# Altium footprint library Connectors THD.PcbLib: 631 footprints (part 18 of 46)
Each footprint in its own frame and in the unit in brackets; x right, y up, seen from the top. Pads: shape width x height; smd on the part's side, far side on the other; paste and mask are expansions set on the pad; w line width, h text height; cw(c..) or ccw(c..) is an arc to the next point about the centre after c.
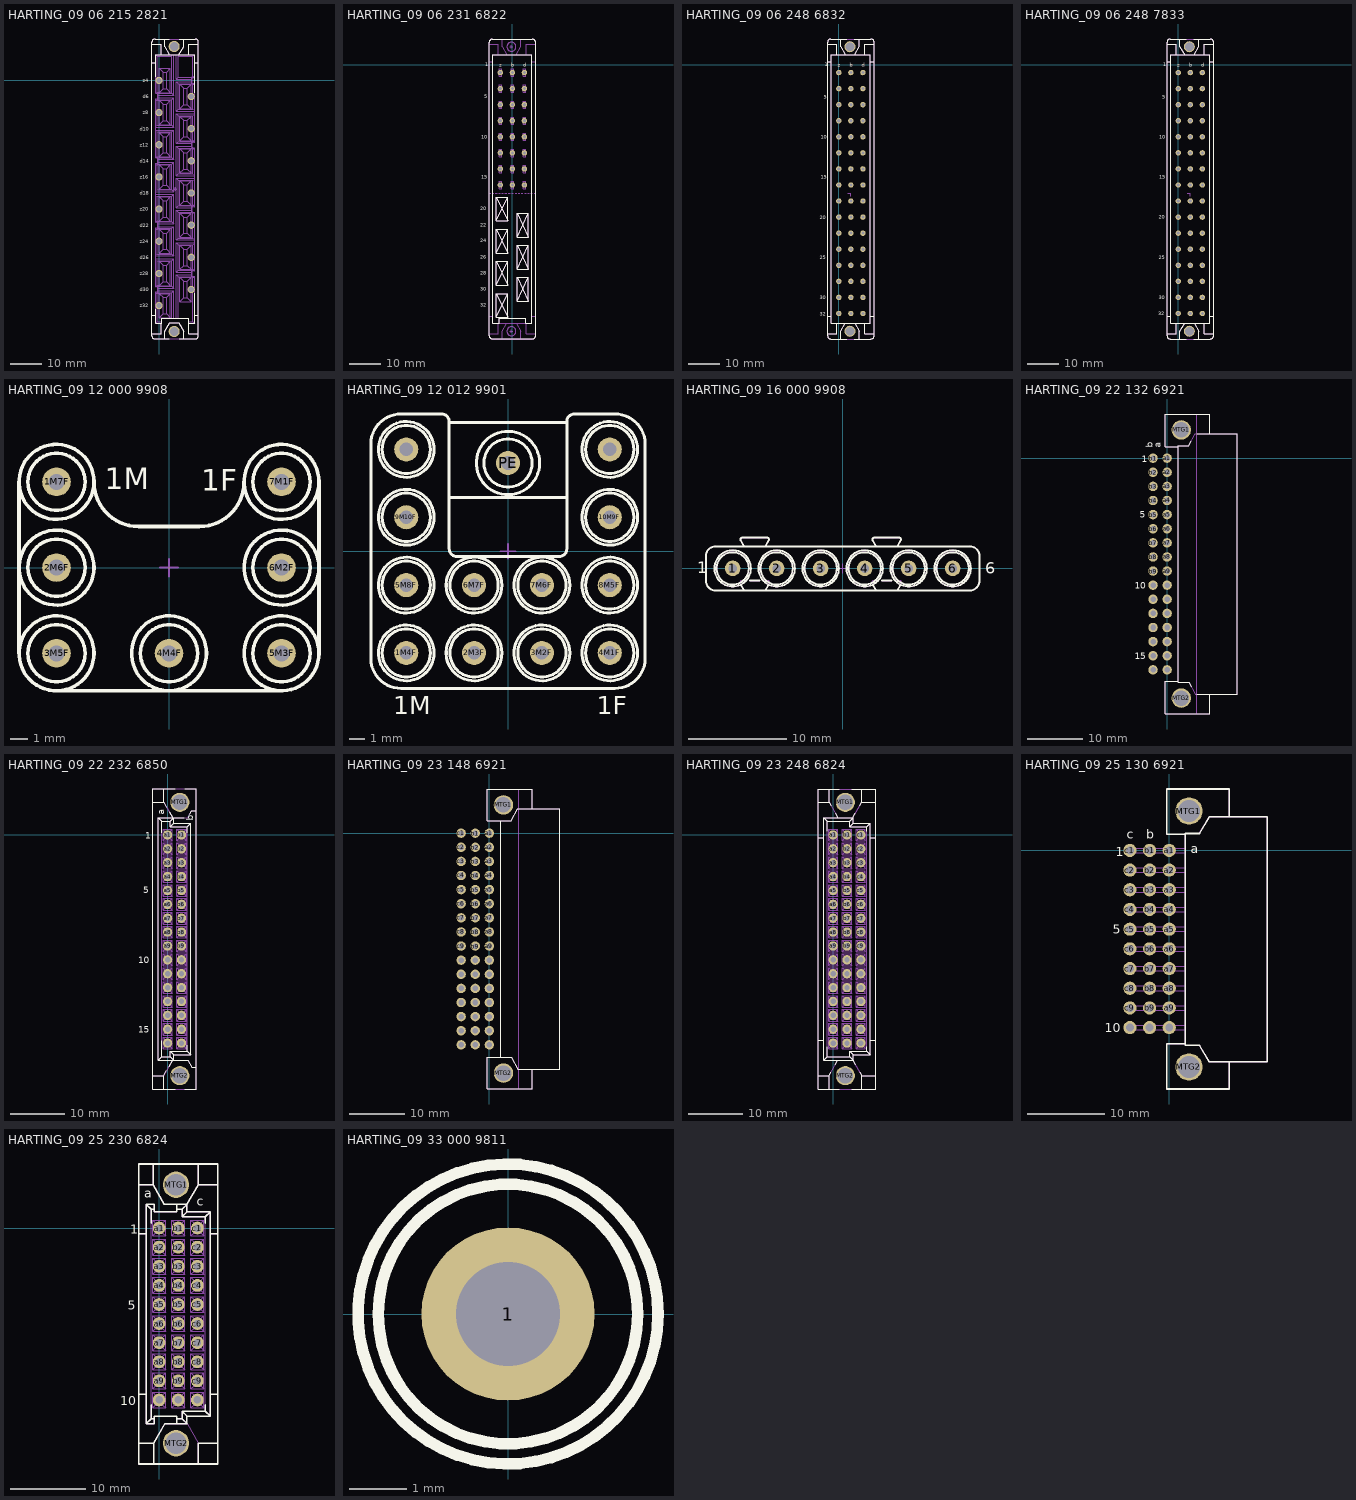
[diagram p17: the footprints below, top view; thin cyan lines are the x and y axes]

## HARTING_09 06 215 2821 [mm] "DIN 41612, Type H, 15 Poles, Rows z+d, Performance level 1, Low Profile Straight Female Connector, Lead 4.0 mm, Pitch 5.08mm"
height 10.1
pads (17):
  round 2.3 hole 1.6: d6(10.16,-5.08) d10(10.16,-15.24) d14(10.16,-25.4) d18(10.16,-35.56) d22(10.16,-45.72) d26(10.16,-55.88) d30(10.16,-66.04) z4(0,0) z8(0,-10.16) z12(0,-20.32) z16(0,-30.48) z20(0,-40.64) z24(0,-50.8) z28(0,-60.96) z32(0,-71.12)
  round 3.5 / inner round 3.5 / far side round 5.1 hole 2.8: MTG1(4.78,10.71) MTG2(4.78,-79.29)
Top Overlay:
  lines w0.2: -1.105,-74.24 -2.27,-74.24 ; -1.105,-72.277 -1.105,-76.7 0.855,-76.7 0.855,-76.15 0.855,-75.13 9.305,-75.13 9.305,-76.15 9.305,-76.7 11.265,-76.7 11.265,-67.197 ; -1.105,1.157 -1.105,8.12 11.265,8.12 11.265,-3.923 ; -1.105,5.66 -2.27,5.66 ; 0.705,-76.7 0.705,-80.04 -2.27,-80.04 ; 0.705,8.12 0.705,11.46 -2.27,11.46 ; 3.175,-81.665 1.805,-81.665 ; 3.175,13.085 1.805,13.085 ; 3.3,8.12 1.805,10.71 1.805,13.085 ; 6.26,8.12 7.755,10.71 7.755,13.085 ; 6.385,-81.665 7.755,-81.665 ; 6.385,13.085 7.755,13.085 ; 9.455,-76.7 9.455,-80.04 12.43,-80.04 ; 9.455,8.12 9.455,11.46 12.43,11.46 ; 11.265,-74.24 12.43,-74.24 ; 11.265,5.66 12.43,5.66 ; -2.27,-80.04 -2.27,-80.665 ccw(c-1.27,-80.665) -1.27,-81.665 1.805,-81.665 ; -2.27,-80.04 -2.27,-74.24 ; -2.27,-74.24 -2.27,5.66 ; -2.27,5.66 -2.27,11.46 ; -2.27,11.46 -2.27,12.085 cw(c-1.27,12.085) -1.27,13.085 1.805,13.085 ; 1.805,-81.665 1.805,-79.29 3.378,-76.565 6.182,-76.565 7.755,-79.29 7.755,-81.665 ; 7.755,-81.665 11.43,-81.665 ccw(c11.43,-80.665) 12.43,-80.665 12.43,-80.04 ; 7.755,13.085 11.43,13.085 cw(c11.43,12.085) 12.43,12.085 12.43,11.46 ; 12.43,-80.04 12.43,-74.24 ; 12.43,-74.24 12.43,5.66 ; 12.43,5.66 12.43,11.46
  text "z32" at -6.02,-71.695 h1.2
  text "z28" at -6.02,-61.535 h1.2
  text "d30" at -6.02,-66.615 h1.2
  text "z24" at -6.02,-51.375 h1.2
  text "d26" at -6.145,-56.455 h1.2
  text "z20" at -6.02,-41.215 h1.2
  text "d22" at -6.02,-46.295 h1.2
  text "z16" at -6.02,-31.055 h1.2
  text "d18" at -6.02,-36.135 h1.2
  text "z12" at -6.02,-20.895 h1.2
  text "d14" at -6.02,-25.975 h1.2
  text "z8" at -5.125,-10.685 h1.2
  text "d10" at -6.02,-15.815 h1.2
  text "d6" at -5.125,-5.605 h1.2
  text "z4" at -5.125,-0.525 h1.2
Mechanical 8:
  lines w0.1: -0.5,-71.12 0,-71.12 ; -0.5,-60.96 0,-60.96 ; -0.5,-50.8 0,-50.8 ; -0.5,-40.64 0,-40.64 ; -0.5,-30.48 0,-30.48 ; -0.5,-20.32 0,-20.32 ; -0.5,-10.16 0,-10.16 ; -0.5,0 0,0 ; 0,-71.62 0,-71.12 ; 0,-70.62 0,-71.12 ; 0,-61.46 0,-60.96 ; 0,-60.46 0,-60.96 ; 0,-51.3 0,-50.8 ; 0,-50.3 0,-50.8 ; 0,-41.14 0,-40.64 ; 0,-40.14 0,-40.64 ; 0,-30.98 0,-30.48 ; 0,-29.98 0,-30.48 ; 0,-20.82 0,-20.32 ; 0,-19.82 0,-20.32 ; 0,-10.66 0,-10.16 ; 0,-9.66 0,-10.16 ; 0,-0.5 0,0 ; 0,0.5 0,0 ; 0.5,-71.12 0,-71.12 ; 0.5,-60.96 0,-60.96 ; 0.5,-50.8 0,-50.8 ; 0.5,-40.64 0,-40.64 ; 0.5,-30.48 0,-30.48 ; 0.5,-20.32 0,-20.32 ; 0.5,-10.16 0,-10.16 ; 0.5,0 0,0 ; 4.28,-79.29 4.78,-79.29 ; 4.28,10.71 4.78,10.71 ; 4.78,-79.79 4.78,-79.29 ; 4.78,-78.79 4.78,-79.29 ; 4.78,10.21 4.78,10.71 ; 4.78,11.21 4.78,10.71 ; 5.28,-79.29 4.78,-79.29 ; 5.28,10.71 4.78,10.71 ; 9.66,-66.04 10.16,-66.04 ; 9.66,-55.88 10.16,-55.88 ; 9.66,-45.72 10.16,-45.72 ; 9.66,-35.56 10.16,-35.56 ; 9.66,-25.4 10.16,-25.4 ; 9.66,-15.24 10.16,-15.24 ; 9.66,-5.08 10.16,-5.08 ; 10.16,-66.54 10.16,-66.04 ; 10.16,-65.54 10.16,-66.04 ; 10.16,-56.38 10.16,-55.88 ; 10.16,-55.38 10.16,-55.88 ; 10.16,-46.22 10.16,-45.72 ; 10.16,-45.22 10.16,-45.72 ; 10.16,-36.06 10.16,-35.56 ; 10.16,-35.06 10.16,-35.56 ; 10.16,-25.9 10.16,-25.4 ; 10.16,-24.9 10.16,-25.4 ; 10.16,-15.74 10.16,-15.24 ; 10.16,-14.74 10.16,-15.24 ; 10.16,-5.58 10.16,-5.08 ; 10.16,-4.58 10.16,-5.08 ; 10.66,-66.04 10.16,-66.04 ; 10.66,-55.88 10.16,-55.88 ; 10.66,-45.72 10.16,-45.72 ; 10.66,-35.56 10.16,-35.56 ; 10.66,-25.4 10.16,-25.4 ; 10.66,-15.24 10.16,-15.24 ; 10.66,-5.08 10.16,-5.08 ; 5.08,-34.29 5.08,-33.79 5.08,-34.29 ; 5.08,-34.29 5.58,-34.29 5.08,-34.29 ; 5.08,-34.29 5.08,-34.79 5.08,-34.29 ; 5.08,-34.29 4.58,-34.29 5.08,-34.29
Mechanical 14:
  drawing of 585 lines, arcs and shapes, not listed
  text "z4" at -5.125,-0.525 h1.2
  text "d6" at -5.125,-5.605 h1.2
  text "d10" at -6.02,-15.815 h1.2
  text "z8" at -5.125,-10.685 h1.2
  text "d14" at -6.02,-25.975 h1.2
  text "z12" at -6.02,-20.895 h1.2
  text "d18" at -6.02,-36.135 h1.2
  text "z16" at -6.02,-31.055 h1.2
  text "d22" at -6.02,-46.295 h1.2
  text "z20" at -6.02,-41.215 h1.2
  text "d26" at -6.145,-56.455 h1.2
  text "z24" at -6.02,-51.375 h1.2
  text "d30" at -6.02,-66.615 h1.2
  text "z28" at -6.02,-61.535 h1.2
  text "z32" at -6.02,-71.695 h1.2
  text "z4" at -5.125,-0.525 h1.2
  text "d6" at -5.125,-5.605 h1.2
  text "d10" at -6.02,-15.815 h1.2
  text "z8" at -5.125,-10.685 h1.2
  text "d14" at -6.02,-25.975 h1.2
  text "z12" at -6.02,-20.895 h1.2
  text "d18" at -6.02,-36.135 h1.2
  text "z16" at -6.02,-31.055 h1.2
  text "d22" at -6.02,-46.295 h1.2
  text "z20" at -6.02,-41.215 h1.2
  text "d26" at -6.145,-56.455 h1.2
  text "z24" at -6.02,-51.375 h1.2
  text "d30" at -6.02,-66.615 h1.2
  text "z28" at -6.02,-61.535 h1.2
  text "z32" at -6.02,-71.695 h1.2
  text "z32" at -6.02,-71.695 h1.2
  text "z28" at -6.02,-61.535 h1.2
  text "d30" at -6.02,-66.615 h1.2
  text "z24" at -6.02,-51.375 h1.2
  text "d26" at -6.145,-56.455 h1.2
  text "z20" at -6.02,-41.215 h1.2
  text "d22" at -6.02,-46.295 h1.2
  text "z16" at -6.02,-31.055 h1.2
  text "d18" at -6.02,-36.135 h1.2
  text "z12" at -6.02,-20.895 h1.2
  text "d14" at -6.02,-25.975 h1.2
  text "z8" at -5.125,-10.685 h1.2
  text "d10" at -6.02,-15.815 h1.2
  text "d6" at -5.125,-5.605 h1.2
  text "z4" at -5.125,-0.525 h1.2
3D body: height 10.1, standoff -4, extent -2.27,-81.665 12.43,13.085

## HARTING_09 06 231 6822 [mm] "DIN 41612, Type MH, 24+ 7 Contacts, Rows z+b+d, Performance level 2, Straight Female Connector"
height 20.53
pads (24):
  round 1.7 hole 1: b2(0,-2.54) b4(0,-7.62) b6(0,-12.7) b8(0,-17.78) b10(0,-22.86) b12(0,-27.94) b14(0,-33.02) b16(0,-38.1) d2(3.81,-2.54) d4(3.81,-7.62) d6(3.81,-12.7) d8(3.81,-17.78) d10(3.81,-22.86) d12(3.81,-27.94) d14(3.81,-33.02) d16(3.81,-38.1) z2(-3.81,-2.54) z4(-3.81,-7.62) z6(-3.81,-12.7) z8(-3.81,-17.78) z10(-3.81,-22.86) z12(-3.81,-27.94) z14(-3.81,-33.02) z16(-3.81,-38.1)
Top Overlay:
  lines w0.2: -5.025,-79.965 -1.475,-72.435 ; -5.025,-79.965 -5.025,-72.435 ; -5.025,-79.965 -1.475,-79.965 ; -5.025,-72.435 -1.475,-79.965 ; -5.025,-72.435 -1.475,-72.435 ; -5.025,-69.805 -1.475,-62.275 ; -5.025,-69.805 -5.025,-62.275 ; -5.025,-69.805 -1.475,-69.805 ; -5.025,-62.275 -1.475,-69.805 ; -5.025,-62.275 -1.475,-62.275 ; -5.025,-59.645 -1.475,-52.115 ; -5.025,-59.645 -5.025,-52.115 ; -5.025,-59.645 -1.475,-59.645 ; -5.025,-52.115 -1.475,-59.645 ; -5.025,-52.115 -1.475,-52.115 ; -5.025,-49.485 -1.475,-41.955 ; -5.025,-49.485 -5.025,-41.955 ; -5.025,-49.485 -1.475,-49.485 ; -5.025,-41.955 -1.475,-49.485 ; -5.025,-41.955 -1.475,-41.955 ; -1.475,-79.965 -1.475,-72.435 ; -1.475,-69.805 -1.475,-62.275 ; -1.475,-59.645 -1.475,-52.115 ; -1.475,-49.485 -1.475,-41.955 ; 1.475,-74.885 5.025,-74.885 ; 1.475,-74.885 5.025,-67.355 ; 1.475,-74.885 1.475,-67.355 ; 1.475,-67.355 5.025,-67.355 ; 1.475,-67.355 5.025,-74.885 ; 1.475,-64.725 5.025,-57.195 ; 1.475,-64.725 1.475,-57.195 ; 1.475,-64.725 5.025,-64.725 ; 1.475,-57.195 5.025,-64.725 ; 1.475,-57.195 5.025,-57.195 ; 1.475,-54.565 5.025,-47.035 ; 1.475,-54.565 1.475,-47.035 ; 1.475,-54.565 5.025,-54.565 ; 1.475,-47.035 5.025,-54.565 ; 1.475,-47.035 5.025,-47.035 ; 5.025,-74.885 5.025,-67.355 ; 5.025,-64.725 5.025,-57.195 ; 5.025,-54.565 5.025,-47.035 ; -7.35,-85.745 ccw(c-6.35,-85.745) -6.35,-86.745 6.35,-86.745 ccw(c6.35,-85.745) 7.35,-85.745 7.35,7.005 ccw(c6.35,7.005) 6.35,8.005 -6.35,8.005 ccw(c-6.35,7.005) -7.35,7.005 -7.35,-85.745 ; -6.185,-81.795 -4.165,-81.795 -4.165,-80.265 4.165,-80.265 4.165,-81.795 6.185,-81.795 6.185,3.055 -6.185,3.055 -6.185,-81.795
  text "30" at -10.109,-71.56 h1.2
  text "26" at -10.109,-61.4 h1.2
  text "22" at -10.109,-51.24 h1.2
  text "32" at -10.1,-76.605 h1.2
  text "28" at -10.1,-66.445 h1.2
  text "24" at -10.1,-56.285 h1.2
  text "d" at 3.492,-0.635 h1.2
  text "z" at -4.127,-0.635 h1.2
  text "b" at -0.318,-0.635 h1.2
  text "5" at -8.925,-10.725 h1.2
  text "10" at -9.885,-23.42 h1.2
  text "15" at -9.885,-36.12 h1.2
  text "20" at -10.1,-46.125 h1.2
  text "1" at -8.625,-0.525 h1.2
Mechanical 8:
  lines w0.1: -7.35,-40.64 -6.85,-40.64 ; -6.35,-40.64 -5.85,-40.64 ; -5.35,-40.64 -4.85,-40.64 ; -4.35,-40.64 -3.85,-40.64 ; -4.31,-38.1 -3.81,-38.1 ; -4.31,-33.02 -3.81,-33.02 ; -4.31,-27.94 -3.81,-27.94 ; -4.31,-22.86 -3.81,-22.86 ; -4.31,-17.78 -3.81,-17.78 ; -4.31,-12.7 -3.81,-12.7 ; -4.31,-7.62 -3.81,-7.62 ; -3.81,-38.6 -3.81,-38.1 ; -3.81,-37.6 -3.81,-38.1 ; -3.81,-33.52 -3.81,-33.02 ; -3.81,-32.52 -3.81,-33.02 ; -3.81,-28.44 -3.81,-27.94 ; -3.81,-27.44 -3.81,-27.94 ; -3.81,-23.36 -3.81,-22.86 ; -3.81,-22.36 -3.81,-22.86 ; -3.81,-18.28 -3.81,-17.78 ; -3.81,-17.28 -3.81,-17.78 ; -3.81,-13.2 -3.81,-12.7 ; -3.81,-12.2 -3.81,-12.7 ; -3.81,-8.12 -3.81,-7.62 ; -3.81,-7.12 -3.81,-7.62 ; -3.35,-40.64 -2.85,-40.64 ; -3.31,-38.1 -3.81,-38.1 ; -3.31,-33.02 -3.81,-33.02 ; -3.31,-27.94 -3.81,-27.94 ; -3.31,-22.86 -3.81,-22.86 ; -3.31,-17.78 -3.81,-17.78 ; -3.31,-12.7 -3.81,-12.7 ; -3.31,-7.62 -3.81,-7.62 ; -2.35,-40.64 -1.85,-40.64 ; -1.35,-40.64 -0.65,-40.64 ; -0.8,-84.37 -0.3,-84.37 ; -0.8,5.63 -0.3,5.63 ; -0.5,-38.1 0,-38.1 ; -0.5,-33.02 0,-33.02 ; -0.5,-27.94 0,-27.94 ; -0.5,-22.86 0,-22.86 ; -0.5,-17.78 0,-17.78 ; -0.5,-12.7 0,-12.7 ; -0.5,-7.62 0,-7.62 ; -0.5,-2.54 0,-2.54 ; -0.3,-84.87 -0.3,-84.37 ; -0.3,-83.87 -0.3,-84.37 ; -0.3,5.13 -0.3,5.63 ; -0.3,6.13 -0.3,5.63 ; -0.15,-40.64 0.35,-40.64 ; 0,-38.6 0,-38.1 ; 0,-37.6 0,-38.1 ; 0,-33.52 0,-33.02 ; 0,-32.52 0,-33.02 ; 0,-28.44 0,-27.94 ; 0,-27.44 0,-27.94 ; 0,-23.36 0,-22.86 ; 0,-22.36 0,-22.86 ; 0,-18.28 0,-17.78 ; 0,-17.28 0,-17.78 ; 0,-13.2 0,-12.7 ; 0,-12.2 0,-12.7 ; 0,-8.12 0,-7.62 ; 0,-7.12 0,-7.62 ; 0,-3.04 0,-2.54 ; 0,-2.04 0,-2.54 ; 0.2,-84.37 -0.3,-84.37 ; 0.2,5.63 -0.3,5.63 ; 0.5,-38.1 0,-38.1 ; 0.5,-33.02 0,-33.02 ; 0.5,-27.94 0,-27.94 ; 0.5,-22.86 0,-22.86 ; 0.5,-17.78 0,-17.78 ; 0.5,-12.7 0,-12.7 ; 0.5,-7.62 0,-7.62 ; 0.5,-2.54 0,-2.54 ; 0.85,-40.64 1.35,-40.64 ; 1.85,-40.64 2.35,-40.64 ; 2.85,-40.64 3.35,-40.64 ; 3.31,-38.1 3.81,-38.1 ; 3.31,-33.02 3.81,-33.02 ; 3.31,-27.94 3.81,-27.94 ; 3.31,-22.86 3.81,-22.86 ; 3.31,-17.78 3.81,-17.78 ; 3.31,-12.7 3.81,-12.7 ; 3.31,-7.62 3.81,-7.62 ; 3.31,-2.54 3.81,-2.54 ; 3.81,-38.6 3.81,-38.1 ; 3.81,-37.6 3.81,-38.1 ; 3.81,-33.52 3.81,-33.02 ; 3.81,-32.52 3.81,-33.02 ; 3.81,-28.44 3.81,-27.94 ; 3.81,-27.44 3.81,-27.94 ; 3.81,-23.36 3.81,-22.86 ; 3.81,-22.36 3.81,-22.86 ; 3.81,-18.28 3.81,-17.78 ; 3.81,-17.28 3.81,-17.78 ; 3.81,-13.2 3.81,-12.7 ; 3.81,-12.2 3.81,-12.7 ; 3.81,-8.12 3.81,-7.62 ; 3.81,-7.12 3.81,-7.62 ; 3.81,-3.04 3.81,-2.54 ; 3.81,-2.04 3.81,-2.54 ; 3.85,-40.64 4.35,-40.64 ; 4.31,-38.1 3.81,-38.1 ; 4.31,-33.02 3.81,-33.02 ; 4.31,-27.94 3.81,-27.94 ; 4.31,-22.86 3.81,-22.86 ; 4.31,-17.78 3.81,-17.78 ; 4.31,-12.7 3.81,-12.7 ; 4.31,-7.62 3.81,-7.62 ; 4.31,-2.54 3.81,-2.54 ; 4.85,-40.64 5.35,-40.64 ; 5.85,-40.64 6.35,-40.64 ; 6.85,-40.64 7.35,-40.64 ; -3.81,-2.54 -4.31,-2.54 -3.81,-2.54 ; -3.81,-2.54 -3.81,-2.04 -3.81,-2.54 ; -3.81,-2.54 -3.31,-2.54 -3.81,-2.54 ; -3.81,-2.54 -3.81,-3.04 -3.81,-2.54
Mechanical 14:
  drawing of 190 lines, arcs and shapes, not listed
  text "b" at -0.318,-0.635 h1.2
  text "z" at -4.127,-0.635 h1.2
  text "d" at 3.492,-0.635 h1.2
  text "30" at -10.109,-71.56 h1.2
  text "26" at -10.109,-61.4 h1.2
  text "22" at -10.109,-51.24 h1.2
  text "32" at -10.1,-76.605 h1.2
  text "28" at -10.1,-66.445 h1.2
  text "24" at -10.1,-56.285 h1.2
  text "5" at -8.925,-10.725 h1.2
  text "10" at -9.885,-23.42 h1.2
  text "15" at -9.885,-36.12 h1.2
  text "20" at -10.1,-46.125 h1.2
  text "1" at -8.625,-0.525 h1.2
3D body: height 19.94, standoff -10.98, extent -7.35,-86.745 7.35,8.005

## HARTING_09 06 248 6832 [mm] "DIN 41612, Type F,  Thru-Hole Press-in Terminations;Rows z+b+d, 48 Contacts, Straight Female Connector, Performance level 2, Lead 5.6mm"
height 10.1
pads (50):
  round 1.7 hole 1: b2(3.81,-2.54) b4(3.81,-7.62) b6(3.81,-12.7) b8(3.81,-17.78) b10(3.81,-22.86) b12(3.81,-27.94) b14(3.81,-33.02) b16(3.81,-38.1) b18(3.81,-43.18) b20(3.81,-48.26) b22(3.81,-53.34) b24(3.81,-58.42) b26(3.81,-63.5) b28(3.81,-68.58) b30(3.81,-73.66) b32(3.81,-78.74) d2(7.62,-2.54) d4(7.62,-7.62) d6(7.62,-12.7) d8(7.62,-17.78) d10(7.62,-22.86) d12(7.62,-27.94) d14(7.62,-33.02) d16(7.62,-38.1) d18(7.62,-43.18) d20(7.62,-48.26) d22(7.62,-53.34) d24(7.62,-58.42) d26(7.62,-63.5) d28(7.62,-68.58) d30(7.62,-73.66) d32(7.62,-78.74) z2(0,-2.54) z4(0,-7.62) z6(0,-12.7) z8(0,-17.78) z10(0,-22.86) z12(0,-27.94) z14(0,-33.02) z16(0,-38.1) z18(0,-43.18) z20(0,-48.26) z22(0,-53.34) z24(0,-58.42) z26(0,-63.5) z28(0,-68.58) z30(0,-73.66) z32(0,-78.74)
  round 3.5 / inner round 3.5 / far side round 5.1 hole 2.8: MTG1(3.51,5.63) MTG2(3.51,-84.37)
Top Overlay:
  lines w0.2: -3.54,-85.22 -0.58,-85.22 -0.58,-81.845 ; -3.54,-79.57 -2.365,-79.57 ; -3.54,0.83 -2.365,0.83 ; -3.54,6.48 -0.58,6.48 -0.58,3.105 ; 0.535,-86.82 0.535,-84.37 1.993,-81.845 ; 0.535,8.08 0.535,5.63 1.993,3.105 ; 2.492,-86.82 -2.54,-86.82 cw(c-2.54,-85.82) -3.54,-85.82 -3.54,7.08 cw(c-2.54,7.08) -2.54,8.08 2.492,8.08 ; 4.874,-86.82 10.16,-86.82 ccw(c10.16,-85.82) 11.16,-85.82 11.16,7.08 ccw(c10.16,7.08) 10.16,8.08 4.874,8.08 ; 5.027,-81.845 6.485,-84.37 6.485,-86.82 ; 5.027,3.105 6.485,5.63 6.485,8.08 ; 8.17,-81.845 8.17,-85.22 11.16,-85.22 ; 8.17,3.105 8.17,6.48 11.16,6.48 ; 9.985,-79.57 11.16,-79.57 ; 9.985,0.83 11.16,0.83 ; -2.365,-81.845 9.985,-81.845 9.985,3.105 -2.365,3.105 -2.365,-81.845
  text "b" at 3.493,-0.635 h1.2
  text "z" at -0.317,-0.635 h1.2
  text "d" at 7.303,-0.635 h1.2
  text "1" at -4.49,-0.6 h1.2
  text "30" at -5.967,-74.295 h1.2
  text "25" at -5.967,-61.595 h1.2
  text "20" at -5.967,-48.895 h1.2
  text "15" at -5.75,-36.195 h1.2
  text "10" at -5.75,-23.495 h1.2
  text "5" at -4.79,-10.8 h1.2
  text "32" at -5.99,-79.4 h1.2
Mechanical 8:
  lines w0.1: 2.81,-40.64 3.81,-40.64 3.81,-41.64
Mechanical 14:
  circle w0.1: c3.51,5.63 r1.4
  circle w0.1: c3.51,-84.37 r1.4
  lines w0.1: -3.54,-85.22 -0.58,-85.22 -0.58,-81.845 ; -3.54,-79.57 -2.365,-79.57 ; -3.54,0.83 -2.365,0.83 ; -3.54,6.48 -0.58,6.48 -0.58,3.105 ; 0.535,-86.82 0.535,-84.37 1.993,-81.845 ; 0.535,8.08 0.535,5.63 1.993,3.105 ; 5.027,-81.845 6.485,-84.37 6.485,-86.82 ; 5.027,3.105 6.485,5.63 6.485,8.08 ; 8.17,-81.845 8.17,-85.22 11.16,-85.22 ; 8.17,3.105 8.17,6.48 11.16,6.48 ; 9.985,-79.57 11.16,-79.57 ; 9.985,0.83 11.16,0.83 ; -3.54,-85.82 ccw(c-2.54,-85.82) -2.54,-86.82 10.16,-86.82 ccw(c10.16,-85.82) 11.16,-85.82 11.16,7.08 ccw(c10.16,7.08) 10.16,8.08 -2.54,8.08 ccw(c-2.54,7.08) -3.54,7.08 -3.54,-85.82 ; -2.365,-81.845 -2.365,3.105 9.985,3.105 9.985,-81.845 -2.365,-81.845
  text "d" at 7.303,-0.635 h1.2
  text "z" at -0.317,-0.635 h1.2
  text "b" at 3.493,-0.635 h1.2
  text "1" at -4.49,-0.6 h1.2
  text "30" at -5.967,-74.295 h1.2
  text "25" at -5.967,-61.595 h1.2
  text "20" at -5.967,-48.895 h1.2
  text "15" at -5.75,-36.195 h1.2
  text "10" at -5.75,-23.495 h1.2
  text "5" at -4.79,-10.8 h1.2
  text "32" at -5.99,-79.4 h1.2
Drill Drawing:
  lines w0.1: -2.54,-60.96 -2.54,-81 9.985,-81 9.985,0 -2.54,0 -2.54,-22.86
  text "PRESS-FIT TECHNOLOGY diam. 1mm +0.1 -0" at -1.905,-59.055 h1
3D body: height 10.1, standoff -3.1, extent -3.59,-86.82 11.21,8.08

## HARTING_09 06 248 7833 [mm] "DIN 41612, Type F, 48 Contacts, Rows z+b+d, Performance level 3, Straight Female Connector"
height 10.1
pads (50):
  round 1.7 hole 1: b2(3.81,-2.54) b4(3.81,-7.62) b6(3.81,-12.7) b8(3.81,-17.78) b10(3.81,-22.86) b12(3.81,-27.94) b14(3.81,-33.02) b16(3.81,-38.1) b18(3.81,-43.18) b20(3.81,-48.26) b22(3.81,-53.34) b24(3.81,-58.42) b26(3.81,-63.5) b28(3.81,-68.58) b30(3.81,-73.66) b32(3.81,-78.74) d2(7.62,-2.54) d4(7.62,-7.62) d6(7.62,-12.7) d8(7.62,-17.78) d10(7.62,-22.86) d12(7.62,-27.94) d14(7.62,-33.02) d16(7.62,-38.1) d18(7.62,-43.18) d20(7.62,-48.26) d22(7.62,-53.34) d24(7.62,-58.42) d26(7.62,-63.5) d28(7.62,-68.58) d30(7.62,-73.66) d32(7.62,-78.74) z2(0,-2.54) z4(0,-7.62) z6(0,-12.7) z8(0,-17.78) z10(0,-22.86) z12(0,-27.94) z14(0,-33.02) z16(0,-38.1) z18(0,-43.18) z20(0,-48.26) z22(0,-53.34) z24(0,-58.42) z26(0,-63.5) z28(0,-68.58) z30(0,-73.66) z32(0,-78.74)
  round 3.5 / inner round 3.5 / far side round 5.1 hole 2.8: MTG1(3.51,5.63) MTG2(3.51,-84.37)
Top Overlay:
  lines w0.2: -3.54,-85.22 -0.58,-85.22 -0.58,-81.845 ; -3.54,-79.57 -2.365,-79.57 ; -3.54,0.83 -2.365,0.83 ; -3.54,6.48 -0.58,6.48 -0.58,3.105 ; 0.535,-86.82 0.535,-84.37 1.993,-81.845 ; 0.535,8.08 0.535,5.63 1.993,3.105 ; 2.492,-86.82 -2.54,-86.82 cw(c-2.54,-85.82) -3.54,-85.82 -3.54,7.08 cw(c-2.54,7.08) -2.54,8.08 2.492,8.08 ; 4.874,-86.82 10.16,-86.82 ccw(c10.16,-85.82) 11.16,-85.82 11.16,7.08 ccw(c10.16,7.08) 10.16,8.08 4.874,8.08 ; 5.027,-81.845 6.485,-84.37 6.485,-86.82 ; 5.027,3.105 6.485,5.63 6.485,8.08 ; 8.17,-81.845 8.17,-85.22 11.16,-85.22 ; 8.17,3.105 8.17,6.48 11.16,6.48 ; 9.985,-79.57 11.16,-79.57 ; 9.985,0.83 11.16,0.83 ; -2.365,-81.845 -2.365,3.105 9.985,3.105 9.985,-81.845 -2.365,-81.845
  text "d" at 7.303,-0.635 h1.2
  text "z" at -0.317,-0.635 h1.2
  text "b" at 3.493,-0.635 h1.2
  text "32" at -6.265,-79.35 h1.2
  text "5" at -5.065,-10.75 h1.2
  text "10" at -6.025,-23.445 h1.2
  text "15" at -6.025,-36.145 h1.2
  text "20" at -6.242,-48.845 h1.2
  text "25" at -6.242,-61.545 h1.2
  text "30" at -6.242,-74.245 h1.2
  text "1" at -4.765,-0.55 h1.2
Mechanical 8:
  lines w0.1: 2.81,-40.64 3.81,-40.64 3.81,-41.64
Mechanical 14:
  circle w0.1: c3.51,-84.37 r1.4
  circle w0.1: c3.51,5.63 r1.4
  lines w0.1: -3.54,-85.22 -0.58,-85.22 -0.58,-81.845 ; -3.54,-79.57 -2.365,-79.57 ; -3.54,0.83 -2.365,0.83 ; -3.54,6.48 -0.58,6.48 -0.58,3.105 ; 0.535,-86.82 0.535,-84.37 1.993,-81.845 ; 0.535,8.08 0.535,5.63 1.993,3.105 ; 5.027,-81.845 6.485,-84.37 6.485,-86.82 ; 5.027,3.105 6.485,5.63 6.485,8.08 ; 8.17,-81.845 8.17,-85.22 11.16,-85.22 ; 8.17,3.105 8.17,6.48 11.16,6.48 ; 9.985,-79.57 11.16,-79.57 ; 9.985,0.83 11.16,0.83 ; -3.54,-85.82 ccw(c-2.54,-85.82) -2.54,-86.82 10.16,-86.82 ccw(c10.16,-85.82) 11.16,-85.82 11.16,7.08 ccw(c10.16,7.08) 10.16,8.08 -2.54,8.08 ccw(c-2.54,7.08) -3.54,7.08 -3.54,-85.82 ; -2.365,-81.845 9.985,-81.845 9.985,3.105 -2.365,3.105 -2.365,-81.845
  text "b" at 3.493,-0.635 h1.2
  text "z" at -0.317,-0.635 h1.2
  text "d" at 7.303,-0.635 h1.2
  text "32" at -6.265,-79.35 h1.2
  text "5" at -5.065,-10.75 h1.2
  text "10" at -6.025,-23.445 h1.2
  text "15" at -6.025,-36.145 h1.2
  text "20" at -6.242,-48.845 h1.2
  text "25" at -6.242,-61.545 h1.2
  text "30" at -6.242,-74.245 h1.2
  text "1" at -4.765,-0.55 h1.2
3D body: height 10.1, standoff -3.1, extent -3.59,-86.82 11.21,8.08
